# Altium footprint library Lib.PcbLib: 52 footprints (part 4 of 4)
Each footprint in its own frame and in the unit in brackets; x right, y up, seen from the top. Pads: shape width x height; smd on the part's side, far side on the other; paste and mask are expansions set on the pad; w line width, h text height; cw(c..) or ccw(c..) is an arc to the next point about the centre after c.
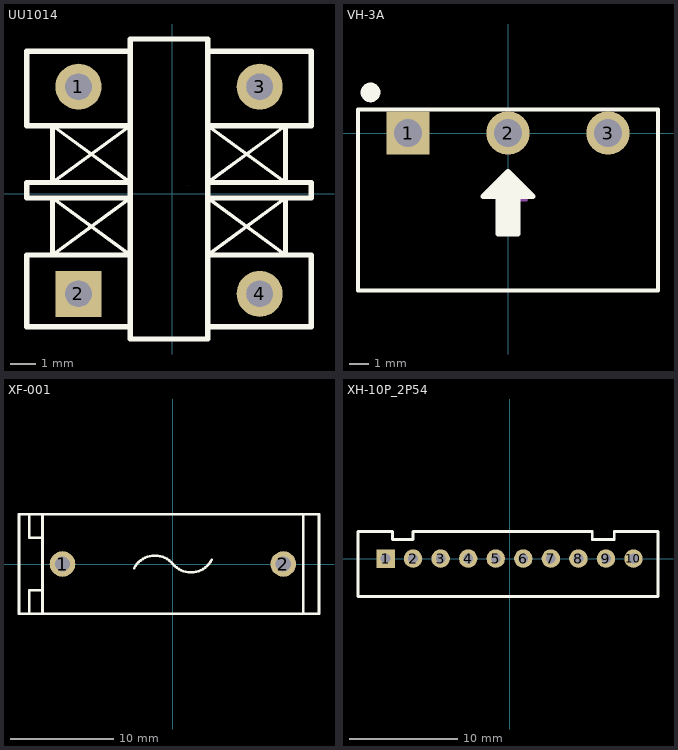
[diagram p3: the footprints below, top view; thin cyan lines are the x and y axes]

## UU1014 [mil]
height 98.43
pads (4):
  round 70 hole 40 slot 40.2 at 0 deg paste-99999 mask+2: 1(-142.33,162.7) 3(133.25,162.75) 4(133.25,-152.25)
  rect 70x70 hole 40 slot 40.2 at 0 deg paste-99999 mask+2: 2(-142.33,-152.25)
Top Overlay:
  lines w5: -181.67,-93.25 -63.67,-6.72 ; -181.67,-6.72 -63.67,-93.25 ; -181.67,16.88 -63.67,103.42 ; -181.67,103.42 -63.67,16.88 ; 54.33,-93.25 172.33,-6.72 ; 54.33,-6.72 172.33,-93.25 ; 54.33,16.88 172.33,103.42 ; 54.33,103.42 172.33,16.88
  lines w8: -181.67,-93.25 -181.67,-6.72 ; -181.67,16.88 -181.67,103.42 ; 172.33,-93.25 172.33,-6.72 ; 172.33,16.88 172.33,103.42 ; -221,-202.25 -63.67,-202.25 -63.67,-93.25 -221,-93.25 -221,-202.25 ; -221,-6.72 -63.67,-6.72 -63.67,16.88 -221,16.88 -221,-6.72 ; -221,103.42 -63.67,103.42 -63.67,216.5 -221,216.5 -221,103.42 ; -63.67,-221 54.33,-221 54.33,235.25 -63.67,235.25 -63.67,-221 ; 54.33,-202.25 211.67,-202.25 211.67,-93.25 54.33,-93.25 54.33,-202.25 ; 54.33,-6.72 211.67,-6.72 211.67,16.88 54.33,16.88 54.33,-6.72 ; 54.33,103.42 211.67,103.42 211.67,216.5 54.33,216.5 54.33,103.42
Mechanical 15:
  lines w0.1: 22.82,12.12 22.84,12.13

## VH-3A [mm]
pads (3):
  rect 2.2x2.2 hole 1.4: 1(-5.08,0)
  round 2.2 hole 1.4: 2(0,0) 3(5.08,0)
Top Overlay:
  circle w0.5: c-6.985,2.061 r0.25
  region: 1.27,-3.222 0,-1.952 -1.27,-3.222 -0.508,-3.222 -0.508,-5.127 0.508,-5.127 0.508,-3.222
  lines w0.2: -7.62,-8 -7.62,1.2 7.62,1.2 7.62,-8 -7.62,-8
  lines w0.254: -1.27,-3.222 0,-1.952 1.27,-3.222 0.508,-3.222 0.508,-5.127 -0.508,-5.127 -0.508,-3.222 -1.27,-3.222
Mechanical 15:
  lines w0.152: 0,-2.465 0,-3.4 0.935,-3.4

## XF-001 [mm]
pads (2):
  round 2.5 hole 1.5: 1(-10.75,0) 2(10.75,0)
Top Overlay:
  lines w0.254: -12.7,-4.826 -12.7,-2.54 ; -12.7,4.826 -12.7,2.54 ; -3.782,-0.419 cw(c-1.751,-1.469) 0,0 ccw(c1.751,1.469) 3.782,0.419 ; 12.446,-4.826 14.224,-4.826 14.224,4.826 12.7,4.826 ; -13.97,-4.826 -13.97,-2.54 -12.7,-2.54 ; -13.97,-4.826 12.7,-4.826 12.7,4.826 ; -13.97,-4.826 -14.986,-4.826 -14.986,4.826 -13.97,4.826 ; -13.97,4.826 -13.97,2.54 -12.7,2.54 ; -13.97,4.826 12.7,4.826 ; -12.7,-2.54 -12.7,2.54
3D body "FU BLX_A.STEP": height 13.9, standoff -3.6, extent -15.05,-4.75 14.299,4.75

## XH-10P_2P54 [mm]
pads (10):
  rect 1.7x1.7 hole 0.9: 1(-11.43,0)
  round 1.7 hole 0.9: 2(-8.89,0) 3(-6.35,0) 4(-3.81,0) 5(-1.27,0) 6(1.27,0) 7(3.81,0) 8(6.35,0) 9(8.89,0) 10(11.43,0)
Top Overlay:
  lines w0.254: -13.97,-3.5 13.691,-3.5 13.691,2.5 9.652,2.5 9.652,1.75 7.62,1.75 7.62,2.5 -8.89,2.5 -8.89,1.75 -10.795,1.75 -10.795,2.5 -13.97,2.5 -13.97,-3.5
3D body "XH2.54-10P.STEP": height 7.03, standoff -2.47, extent -13.93,-3.3 13.93,2.4